# Altium schematic symbol library jlcpcb_2025_04_capacitors_extended_0805.schlib: 3281 symbols (part 16 of 18) (continued)
## GRT21BR71E225KE13L
designator C?  Capacitance: 2.2uF  (hidden comment: *)
Capacitor, Ceramic (MLCC), 2.2uF, ±10%, 25V, X7R, ±10%, SMD 0805; Manufacturer: Murata Electronics; Manufacturer Part Number: GRT21BR71E225KE13L; Package Size: 0805; JLCPCB Basic Part: No; JLCPCB Part Number: C723892; Supplier 1: LCSC; Category: Capacitors - MLCC; Supplier Part Number 1: C723892; Tolerance: ±10%; Voltage Rating: 25V; Temperature Coefficient: X7R; RoHS: Yes; ComponentLink1Description: Datasheet; ComponentLink1URL: https://wmsc.lcsc.com/wmsc/upload/file/pdf/v2/lcsc/2008241234_Murata-Electronics-GRT21BR71E225KE13L_C723892.pdf; ComponentLink2Description: JLCPCB Part URL; ComponentLink2URL: https://jlcpcb.com/partdetail/C723892; ComponentLink3Description: LCSC Part URL; ComponentLink3URL: https://lcsc.com/product-detail/Multilayer-Ceramic-Capacitors-MLCC---SMD-SMT_Murata-Electronics-Murata-Electronics-GRT21BR71E225KE13L_C723892.html
footprint CAP-0805 (0805 (2012M) Capacitor)
pins: 1, 2

## GRT21BR71H104KE01L
designator C?  Capacitance: 100nF  (hidden comment: *)
Capacitor, Ceramic (MLCC), 100nF, ±10%, null, X7R, ±10%, SMD 0805; Manufacturer: Murata Electronics; Manufacturer Part Number: GRT21BR71H104KE01L; Package Size: 0805; JLCPCB Basic Part: No; JLCPCB Part Number: C782178; Supplier 1: LCSC; Category: Capacitors - MLCC; Supplier Part Number 1: C782178; Tolerance: ±10%; Voltage Rating: null; Temperature Coefficient: X7R; RoHS: Yes; ComponentLink1Description: Datasheet; ComponentLink1URL: https://wmsc.lcsc.com/wmsc/upload/file/pdf/v2/lcsc/2009161209_Murata-Electronics-GRT21BR71H104KE01L_C782178.pdf; ComponentLink2Description: JLCPCB Part URL; ComponentLink2URL: https://jlcpcb.com/partdetail/C782178; ComponentLink3Description: LCSC Part URL; ComponentLink3URL: https://lcsc.com/product-detail/Multilayer-Ceramic-Capacitors-MLCC---SMD-SMT_Murata-Electronics-Murata-Electronics-GRT21BR71H104KE01L_C782178.html
footprint CAP-0805 (0805 (2012M) Capacitor)
pins: 1, 2

## GRT21BR71H105KE01L
designator C?  Capacitance: 1uF  (hidden comment: *)
Capacitor, Ceramic (MLCC), 1uF, ±10%, null, X7R, ±10%, SMD 0805; Manufacturer: Murata Electronics; Manufacturer Part Number: GRT21BR71H105KE01L; Package Size: 0805; JLCPCB Basic Part: No; JLCPCB Part Number: C701194; Supplier 1: LCSC; Category: Capacitors - MLCC; Supplier Part Number 1: C701194; Tolerance: ±10%; Voltage Rating: null; Temperature Coefficient: X7R; RoHS: Yes; ComponentLink1Description: Datasheet; ComponentLink1URL: https://wmsc.lcsc.com/wmsc/upload/file/pdf/v2/lcsc/2009161208_Murata-Electronics-GRT21BR71H105KE01L_C701194.pdf; ComponentLink2Description: JLCPCB Part URL; ComponentLink2URL: https://jlcpcb.com/partdetail/C701194; ComponentLink3Description: LCSC Part URL; ComponentLink3URL: https://lcsc.com/product-detail/Multilayer-Ceramic-Capacitors-MLCC---SMD-SMT_Murata-Electronics-Murata-Electronics-GRT21BR71H105KE01L_C701194.html
footprint CAP-0805 (0805 (2012M) Capacitor)
pins: 1, 2

## HGC0805G0101J500NTGJ
designator C?  Capacitance: 100pF  (hidden comment: *)
Capacitor, Ceramic (MLCC), 100pF, ±5%, 50V, C0G, ±5%, SMD 0805; Manufacturer: Chinocera; Manufacturer Part Number: HGC0805G0101J500NTGJ; Package Size: 0805; JLCPCB Basic Part: No; JLCPCB Part Number: C465167; Supplier 1: LCSC; Category: Capacitors - MLCC; Supplier Part Number 1: C465167; Tolerance: ±5%; Voltage Rating: 50V; Temperature Coefficient: C0G; RoHS: Yes; ComponentLink1Description: Datasheet; ComponentLink1URL: https://wmsc.lcsc.com/wmsc/upload/file/pdf/v2/lcsc/2403201120_Chinocera-HGC0805G0101J500NTGJ_C465167.pdf; ComponentLink2Description: JLCPCB Part URL; ComponentLink2URL: https://jlcpcb.com/partdetail/C465167; ComponentLink3Description: LCSC Part URL; ComponentLink3URL: https://lcsc.com/product-detail/Multilayer-Ceramic-Capacitors-MLCC---SMD-SMT_Chinocera-Chinocera-HGC0805G0101J500NTGJ_C465167.html
footprint CAP-0805 (0805 (2012M) Capacitor)
pins: 1, 2

## HGC0805G0270J500NTGJ
designator C?  Capacitance: 27pF  (hidden comment: *)
Capacitor, Ceramic (MLCC), 27pF, ±5%, 50V, C0G, ±5%, SMD 0805; Manufacturer: Chinocera; Manufacturer Part Number: HGC0805G0270J500NTGJ; Package Size: 0805; JLCPCB Basic Part: No; JLCPCB Part Number: C5186741; Supplier 1: LCSC; Category: Capacitors - MLCC; Supplier Part Number 1: C5186741; Tolerance: ±5%; Voltage Rating: 50V; Temperature Coefficient: C0G; RoHS: Yes; ComponentLink1Description: Datasheet; ComponentLink1URL: https://wmsc.lcsc.com/wmsc/upload/file/pdf/v2/lcsc/2403201120_Chinocera-HGC0805G0270J500NTGJ_C5186741.pdf; ComponentLink2Description: JLCPCB Part URL; ComponentLink2URL: https://jlcpcb.com/partdetail/C5186741; ComponentLink3Description: LCSC Part URL; ComponentLink3URL: https://lcsc.com/product-detail/Multilayer-Ceramic-Capacitors-MLCC---SMD-SMT_Chinocera-Chinocera-HGC0805G0270J500NTGJ_C5186741.html
footprint CAP-0805 (0805 (2012M) Capacitor)
pins: 1, 2

## HGC0805G0300J500NTHJ
designator C?  Capacitance: 30pF  (hidden comment: *)
Capacitor, Ceramic (MLCC), 30pF, ±5%, 50V, C0G, ±5%, SMD 0805; Manufacturer: Chinocera; Manufacturer Part Number: HGC0805G0300J500NTHJ; Package Size: 0805; JLCPCB Basic Part: No; JLCPCB Part Number: C465169; Supplier 1: LCSC; Category: Capacitors - MLCC; Supplier Part Number 1: C465169; Tolerance: ±5%; Voltage Rating: 50V; Temperature Coefficient: C0G; RoHS: Yes; ComponentLink1Description: Datasheet; ComponentLink1URL: https://wmsc.lcsc.com/wmsc/upload/file/pdf/v2/lcsc/2403201120_Chinocera-HGC0805G0300J500NTHJ_C465169.pdf; ComponentLink2Description: JLCPCB Part URL; ComponentLink2URL: https://jlcpcb.com/partdetail/C465169; ComponentLink3Description: LCSC Part URL; ComponentLink3URL: https://lcsc.com/product-detail/Multilayer-Ceramic-Capacitors-MLCC---SMD-SMT_Chinocera-Chinocera-HGC0805G0300J500NTHJ_C465169.html
footprint CAP-0805 (0805 (2012M) Capacitor)
pins: 1, 2

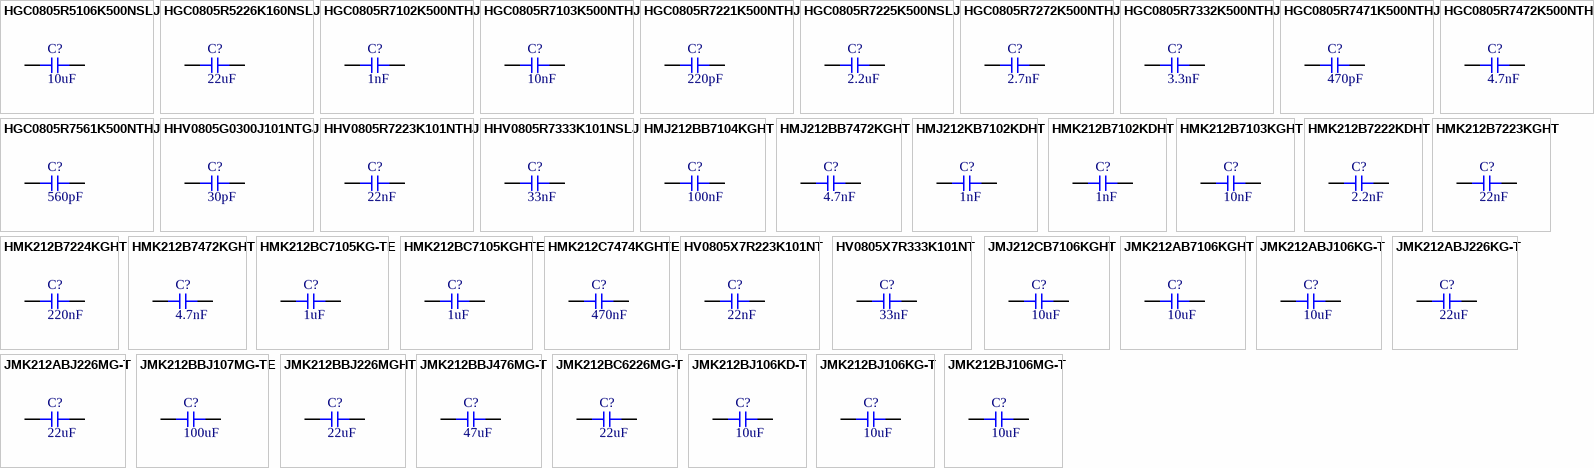
[diagram p70: symbols HGC0805R5106K500NSLJ to JMK212BJ106MG-T]

## HGC0805R5106K500NSLJ
designator C?  Capacitance: 10uF  (hidden comment: *)
Capacitor, Ceramic (MLCC), 10uF, ±10%, 50V, X5R, ±10%, SMD 0805; Manufacturer: Chinocera; Manufacturer Part Number: HGC0805R5106K500NSLJ; Package Size: 0805; JLCPCB Basic Part: No; JLCPCB Part Number: C22367830; Supplier 1: LCSC; Category: Capacitors - MLCC; Supplier Part Number 1: C22367830; Tolerance: ±10%; Voltage Rating: 50V; Temperature Coefficient: X5R; RoHS: Yes; ComponentLink1Description: Datasheet; ComponentLink1URL: https://wmsc.lcsc.com/wmsc/upload/file/pdf/v2/lcsc/2403261047_Chinocera-HGC0805R5106K500NSLJ_C22367830.pdf; ComponentLink2Description: JLCPCB Part URL; ComponentLink2URL: https://jlcpcb.com/partdetail/C22367830; ComponentLink3Description: LCSC Part URL; ComponentLink3URL: https://lcsc.com/product-detail/Multilayer-Ceramic-Capacitors-MLCC---SMD-SMT_Chinocera-Chinocera-HGC0805R5106K500NSLJ_C22367830.html
footprint CAP-0805 (0805 (2012M) Capacitor)
pins: 1, 2

## HGC0805R5226K160NSLJ
designator C?  Capacitance: 22uF  (hidden comment: *)
Capacitor, Ceramic (MLCC), 22uF, ±10%, 16V, X5R, ±10%, SMD 0805; Manufacturer: Chinocera; Manufacturer Part Number: HGC0805R5226K160NSLJ; Package Size: 0805; JLCPCB Basic Part: No; JLCPCB Part Number: C7472967; Supplier 1: LCSC; Category: Capacitors - MLCC; Supplier Part Number 1: C7472967; Tolerance: ±10%; Voltage Rating: 16V; Temperature Coefficient: X5R; RoHS: Yes; ComponentLink1Description: Datasheet; ComponentLink1URL: https://wmsc.lcsc.com/wmsc/upload/file/pdf/v2/lcsc/2403201122_Chinocera-HGC0805R5226K160NSLJ_C7472967.pdf; ComponentLink2Description: JLCPCB Part URL; ComponentLink2URL: https://jlcpcb.com/partdetail/C7472967; ComponentLink3Description: LCSC Part URL; ComponentLink3URL: https://lcsc.com/product-detail/Multilayer-Ceramic-Capacitors-MLCC---SMD-SMT_Chinocera-Chinocera-HGC0805R5226K160NSLJ_C7472967.html
footprint CAP-0805 (0805 (2012M) Capacitor)
pins: 1, 2

## HGC0805R7102K500NTHJ
designator C?  Capacitance: 1nF  (hidden comment: *)
Capacitor, Ceramic (MLCC), 1nF, ±10%, 50V, X7R, ±10%, SMD 0805; Manufacturer: Chinocera; Manufacturer Part Number: HGC0805R7102K500NTHJ; Package Size: 0805; JLCPCB Basic Part: No; JLCPCB Part Number: C465161; Supplier 1: LCSC; Category: Capacitors - MLCC; Supplier Part Number 1: C465161; Tolerance: ±10%; Voltage Rating: 50V; Temperature Coefficient: X7R; RoHS: Yes; ComponentLink1Description: Datasheet; ComponentLink1URL: https://wmsc.lcsc.com/wmsc/upload/file/pdf/v2/lcsc/2403201120_Chinocera-HGC0805R7102K500NTHJ_C465161.pdf; ComponentLink2Description: JLCPCB Part URL; ComponentLink2URL: https://jlcpcb.com/partdetail/C465161; ComponentLink3Description: LCSC Part URL; ComponentLink3URL: https://lcsc.com/product-detail/Multilayer-Ceramic-Capacitors-MLCC---SMD-SMT_Chinocera-Chinocera-HGC0805R7102K500NTHJ_C465161.html
footprint CAP-0805 (0805 (2012M) Capacitor)
pins: 1, 2

## HGC0805R7103K500NTHJ
designator C?  Capacitance: 10nF  (hidden comment: *)
Capacitor, Ceramic (MLCC), 10nF, ±10%, 50V, X7R, ±10%, SMD 0805; Manufacturer: Chinocera; Manufacturer Part Number: HGC0805R7103K500NTHJ; Package Size: 0805; JLCPCB Basic Part: No; JLCPCB Part Number: C465162; Supplier 1: LCSC; Category: Capacitors - MLCC; Supplier Part Number 1: C465162; Tolerance: ±10%; Voltage Rating: 50V; Temperature Coefficient: X7R; RoHS: Yes; ComponentLink1Description: Datasheet; ComponentLink1URL: https://wmsc.lcsc.com/wmsc/upload/file/pdf/v2/lcsc/2403201120_Chinocera-HGC0805R7103K500NTHJ_C465162.pdf; ComponentLink2Description: JLCPCB Part URL; ComponentLink2URL: https://jlcpcb.com/partdetail/C465162; ComponentLink3Description: LCSC Part URL; ComponentLink3URL: https://lcsc.com/product-detail/Multilayer-Ceramic-Capacitors-MLCC---SMD-SMT_Chinocera-Chinocera-HGC0805R7103K500NTHJ_C465162.html
footprint CAP-0805 (0805 (2012M) Capacitor)
pins: 1, 2

## HGC0805R7221K500NTHJ
designator C?  Capacitance: 220pF  (hidden comment: *)
Capacitor, Ceramic (MLCC), 220pF, ±10%, 50V, X7R, ±10%, SMD 0805; Manufacturer: Chinocera; Manufacturer Part Number: HGC0805R7221K500NTHJ; Package Size: 0805; JLCPCB Basic Part: No; JLCPCB Part Number: C465163; Supplier 1: LCSC; Category: Capacitors - MLCC; Supplier Part Number 1: C465163; Tolerance: ±10%; Voltage Rating: 50V; Temperature Coefficient: X7R; RoHS: Yes; ComponentLink1Description: Datasheet; ComponentLink1URL: https://wmsc.lcsc.com/wmsc/upload/file/pdf/v2/lcsc/2403201120_Chinocera-HGC0805R7221K500NTHJ_C465163.pdf; ComponentLink2Description: JLCPCB Part URL; ComponentLink2URL: https://jlcpcb.com/partdetail/C465163; ComponentLink3Description: LCSC Part URL; ComponentLink3URL: https://lcsc.com/product-detail/Multilayer-Ceramic-Capacitors-MLCC---SMD-SMT_Chinocera-Chinocera-HGC0805R7221K500NTHJ_C465163.html
footprint CAP-0805 (0805 (2012M) Capacitor)
pins: 1, 2

## HGC0805R7225K500NSLJ
designator C?  Capacitance: 2.2uF  (hidden comment: *)
Capacitor, Ceramic (MLCC), 2.2uF, ±10%, null, X7R, ±10%, SMD 0805; Manufacturer: Chinocera; Manufacturer Part Number: HGC0805R7225K500NSLJ; Package Size: 0805; JLCPCB Basic Part: No; JLCPCB Part Number: C7432779; Supplier 1: LCSC; Category: Capacitors - MLCC; Supplier Part Number 1: C7432779; Tolerance: ±10%; Voltage Rating: null; Temperature Coefficient: X7R; RoHS: Yes; ComponentLink1Description: Datasheet; ComponentLink1URL: https://wmsc.lcsc.com/wmsc/upload/file/pdf/v2/lcsc/2403201122_Chinocera-HGC0805R7225K500NSLJ_C7432779.pdf; ComponentLink2Description: JLCPCB Part URL; ComponentLink2URL: https://jlcpcb.com/partdetail/C7432779; ComponentLink3Description: LCSC Part URL; ComponentLink3URL: https://lcsc.com/product-detail/Multilayer-Ceramic-Capacitors-MLCC---SMD-SMT_Chinocera-Chinocera-HGC0805R7225K500NSLJ_C7432779.html
footprint CAP-0805 (0805 (2012M) Capacitor)
pins: 1, 2

## HGC0805R7272K500NTHJ
designator C?  Capacitance: 2.7nF  (hidden comment: *)
Capacitor, Ceramic (MLCC), 2.7nF, ±10%, 50V, X7R, ±10%, SMD 0805; Manufacturer: Chinocera; Manufacturer Part Number: HGC0805R7272K500NTHJ; Package Size: 0805; JLCPCB Basic Part: No; JLCPCB Part Number: C5186791; Supplier 1: LCSC; Category: Capacitors - MLCC; Supplier Part Number 1: C5186791; Tolerance: ±10%; Voltage Rating: 50V; Temperature Coefficient: X7R; RoHS: Yes; ComponentLink1Description: Datasheet; ComponentLink1URL: https://wmsc.lcsc.com/wmsc/upload/file/pdf/v2/lcsc/2403201121_Chinocera-HGC0805R7272K500NTHJ_C5186791.pdf; ComponentLink2Description: JLCPCB Part URL; ComponentLink2URL: https://jlcpcb.com/partdetail/C5186791; ComponentLink3Description: LCSC Part URL; ComponentLink3URL: https://lcsc.com/product-detail/Multilayer-Ceramic-Capacitors-MLCC---SMD-SMT_Chinocera-Chinocera-HGC0805R7272K500NTHJ_C5186791.html
footprint CAP-0805 (0805 (2012M) Capacitor)
pins: 1, 2

## HGC0805R7332K500NTHJ
designator C?  Capacitance: 3.3nF  (hidden comment: *)
Capacitor, Ceramic (MLCC), 3.3nF, ±10%, 50V, X7R, ±10%, SMD 0805; Manufacturer: Chinocera; Manufacturer Part Number: HGC0805R7332K500NTHJ; Package Size: 0805; JLCPCB Basic Part: No; JLCPCB Part Number: C465164; Supplier 1: LCSC; Category: Capacitors - MLCC; Supplier Part Number 1: C465164; Tolerance: ±10%; Voltage Rating: 50V; Temperature Coefficient: X7R; RoHS: Yes; ComponentLink1Description: Datasheet; ComponentLink1URL: https://wmsc.lcsc.com/wmsc/upload/file/pdf/v2/lcsc/2403201120_Chinocera-HGC0805R7332K500NTHJ_C465164.pdf; ComponentLink2Description: JLCPCB Part URL; ComponentLink2URL: https://jlcpcb.com/partdetail/C465164; ComponentLink3Description: LCSC Part URL; ComponentLink3URL: https://lcsc.com/product-detail/Multilayer-Ceramic-Capacitors-MLCC---SMD-SMT_Chinocera-Chinocera-HGC0805R7332K500NTHJ_C465164.html
footprint CAP-0805 (0805 (2012M) Capacitor)
pins: 1, 2

## HGC0805R7471K500NTHJ
designator C?  Capacitance: 470pF  (hidden comment: *)
Capacitor, Ceramic (MLCC), 470pF, ±10%, 50V, X7R, ±10%, SMD 0805; Manufacturer: Chinocera; Manufacturer Part Number: HGC0805R7471K500NTHJ; Package Size: 0805; JLCPCB Basic Part: No; JLCPCB Part Number: C465165; Supplier 1: LCSC; Category: Capacitors - MLCC; Supplier Part Number 1: C465165; Tolerance: ±10%; Voltage Rating: 50V; Temperature Coefficient: X7R; RoHS: Yes; ComponentLink1Description: Datasheet; ComponentLink1URL: https://wmsc.lcsc.com/wmsc/upload/file/pdf/v2/lcsc/2403201120_Chinocera-HGC0805R7471K500NTHJ_C465165.pdf; ComponentLink2Description: JLCPCB Part URL; ComponentLink2URL: https://jlcpcb.com/partdetail/C465165; ComponentLink3Description: LCSC Part URL; ComponentLink3URL: https://lcsc.com/product-detail/Multilayer-Ceramic-Capacitors-MLCC---SMD-SMT_Chinocera-Chinocera-HGC0805R7471K500NTHJ_C465165.html
footprint CAP-0805 (0805 (2012M) Capacitor)
pins: 1, 2

## HGC0805R7472K500NTHJ
designator C?  Capacitance: 4.7nF  (hidden comment: *)
Capacitor, Ceramic (MLCC), 4.7nF, ±10%, 50V, X7R, ±10%, SMD 0805; Manufacturer: Chinocera; Manufacturer Part Number: HGC0805R7472K500NTHJ; Package Size: 0805; JLCPCB Basic Part: No; JLCPCB Part Number: C465166; Supplier 1: LCSC; Category: Capacitors - MLCC; Supplier Part Number 1: C465166; Tolerance: ±10%; Voltage Rating: 50V; Temperature Coefficient: X7R; RoHS: Yes; ComponentLink1Description: Datasheet; ComponentLink1URL: https://wmsc.lcsc.com/wmsc/upload/file/pdf/v2/lcsc/2403201120_Chinocera-HGC0805R7472K500NTHJ_C465166.pdf; ComponentLink2Description: JLCPCB Part URL; ComponentLink2URL: https://jlcpcb.com/partdetail/C465166; ComponentLink3Description: LCSC Part URL; ComponentLink3URL: https://lcsc.com/product-detail/Multilayer-Ceramic-Capacitors-MLCC---SMD-SMT_Chinocera-Chinocera-HGC0805R7472K500NTHJ_C465166.html
footprint CAP-0805 (0805 (2012M) Capacitor)
pins: 1, 2

## HGC0805R7561K500NTHJ
designator C?  Capacitance: 560pF  (hidden comment: *)
Capacitor, Ceramic (MLCC), 560pF, ±10%, 50V, X7R, ±10%, SMD 0805; Manufacturer: Chinocera; Manufacturer Part Number: HGC0805R7561K500NTHJ; Package Size: 0805; JLCPCB Basic Part: No; JLCPCB Part Number: C5186812; Supplier 1: LCSC; Category: Capacitors - MLCC; Supplier Part Number 1: C5186812; Tolerance: ±10%; Voltage Rating: 50V; Temperature Coefficient: X7R; RoHS: Yes; ComponentLink1Description: Datasheet; ComponentLink1URL: https://wmsc.lcsc.com/wmsc/upload/file/pdf/v2/lcsc/2403201121_Chinocera-HGC0805R7561K500NTHJ_C5186812.pdf; ComponentLink2Description: JLCPCB Part URL; ComponentLink2URL: https://jlcpcb.com/partdetail/C5186812; ComponentLink3Description: LCSC Part URL; ComponentLink3URL: https://lcsc.com/product-detail/Multilayer-Ceramic-Capacitors-MLCC---SMD-SMT_Chinocera-Chinocera-HGC0805R7561K500NTHJ_C5186812.html
footprint CAP-0805 (0805 (2012M) Capacitor)
pins: 1, 2

## HHV0805G0300J101NTGJ
designator C?  Capacitance: 30pF  (hidden comment: *)
Capacitor, Ceramic (MLCC), 30pF, 100V, C0G, SMD 0805; Manufacturer: Chinocera; Manufacturer Part Number: HHV0805G0300J101NTGJ; Package Size: 0805; JLCPCB Basic Part: No; JLCPCB Part Number: C5186745; Supplier 1: LCSC; Category: Capacitors - MLCC; Supplier Part Number 1: C5186745; Voltage Rating: 100V; Temperature Coefficient: C0G; RoHS: Yes; ComponentLink1Description: Datasheet; ComponentLink1URL: https://wmsc.lcsc.com/wmsc/upload/file/pdf/v2/lcsc/2403201120_Chinocera-HHV0805G0300J101NTGJ_C5186745.pdf; ComponentLink2Description: JLCPCB Part URL; ComponentLink2URL: https://jlcpcb.com/partdetail/C5186745; ComponentLink3Description: LCSC Part URL; ComponentLink3URL: https://lcsc.com/product-detail/Multilayer-Ceramic-Capacitors-MLCC---SMD-SMT_Chinocera-Chinocera-HHV0805G0300J101NTGJ_C5186745.html
footprint CAP-0805 (0805 (2012M) Capacitor)
pins: 1, 2

## HHV0805R7223K101NTHJ
designator C?  Capacitance: 22nF  (hidden comment: *)
Capacitor, Ceramic (MLCC), 22nF, ±10%, 100V, X7R, ±10%, SMD 0805; Manufacturer: Chinocera; Manufacturer Part Number: HHV0805R7223K101NTHJ; Package Size: 0805; JLCPCB Basic Part: No; JLCPCB Part Number: C5186789; Supplier 1: LCSC; Category: Capacitors - MLCC; Supplier Part Number 1: C5186789; Tolerance: ±10%; Voltage Rating: 100V; Temperature Coefficient: X7R; RoHS: Yes; ComponentLink1Description: Datasheet; ComponentLink1URL: https://wmsc.lcsc.com/wmsc/upload/file/pdf/v2/lcsc/2403201121_Chinocera-HHV0805R7223K101NTHJ_C5186789.pdf; ComponentLink2Description: JLCPCB Part URL; ComponentLink2URL: https://jlcpcb.com/partdetail/C5186789; ComponentLink3Description: LCSC Part URL; ComponentLink3URL: https://lcsc.com/product-detail/Multilayer-Ceramic-Capacitors-MLCC---SMD-SMT_Chinocera-Chinocera-HHV0805R7223K101NTHJ_C5186789.html
footprint CAP-0805 (0805 (2012M) Capacitor)
pins: 1, 2

## HHV0805R7333K101NSLJ
designator C?  Capacitance: 33nF  (hidden comment: *)
Capacitor, Ceramic (MLCC), 33nF, ±10%, 100V, X7R, ±10%, SMD 0805; Manufacturer: Chinocera; Manufacturer Part Number: HHV0805R7333K101NSLJ; Package Size: 0805; JLCPCB Basic Part: No; JLCPCB Part Number: C5186796; Supplier 1: LCSC; Category: Capacitors - MLCC; Supplier Part Number 1: C5186796; Tolerance: ±10%; Voltage Rating: 100V; Temperature Coefficient: X7R; RoHS: Yes; ComponentLink1Description: Datasheet; ComponentLink1URL: https://wmsc.lcsc.com/wmsc/upload/file/pdf/v2/lcsc/2403201121_Chinocera-HHV0805R7333K101NSLJ_C5186796.pdf; ComponentLink2Description: JLCPCB Part URL; ComponentLink2URL: https://jlcpcb.com/partdetail/C5186796; ComponentLink3Description: LCSC Part URL; ComponentLink3URL: https://lcsc.com/product-detail/Multilayer-Ceramic-Capacitors-MLCC---SMD-SMT_Chinocera-Chinocera-HHV0805R7333K101NSLJ_C5186796.html
footprint CAP-0805 (0805 (2012M) Capacitor)
pins: 1, 2

## HMJ212BB7104KGHT
designator C?  Capacitance: 100nF  (hidden comment: *)
Capacitor, Ceramic (MLCC), 100nF, ±10%, 100V, X7R, ±10%, SMD 0805; Manufacturer: Taiyo Yuden; Manufacturer Part Number: HMJ212BB7104KGHT; Package Size: 0805; JLCPCB Basic Part: No; JLCPCB Part Number: C651015; Supplier 1: LCSC; Category: Capacitors - MLCC; Supplier Part Number 1: C651015; Tolerance: ±10%; Voltage Rating: 100V; Temperature Coefficient: X7R; RoHS: Yes; ComponentLink1Description: Datasheet; ComponentLink1URL: https://wmsc.lcsc.com/wmsc/upload/file/pdf/v2/lcsc/2304140030_Taiyo-Yuden-HMJ212BB7104KGHT_C651015.pdf; ComponentLink2Description: JLCPCB Part URL; ComponentLink2URL: https://jlcpcb.com/partdetail/C651015; ComponentLink3Description: LCSC Part URL; ComponentLink3URL: https://lcsc.com/product-detail/Multilayer-Ceramic-Capacitors-MLCC---SMD-SMT_Taiyo-Yuden-Taiyo-Yuden-HMJ212BB7104KGHT_C651015.html
footprint CAP-0805 (0805 (2012M) Capacitor)
pins: 1, 2

## HMJ212BB7472KGHT
designator C?  Capacitance: 4.7nF  (hidden comment: *)
Capacitor, Ceramic (MLCC), 4.7nF, ±10%, 100V, X7R, ±10%, SMD 0805; Manufacturer: Taiyo Yuden; Manufacturer Part Number: HMJ212BB7472KGHT; Package Size: 0805; JLCPCB Basic Part: No; JLCPCB Part Number: C2175141; Supplier 1: LCSC; Category: Capacitors - MLCC; Supplier Part Number 1: C2175141; Tolerance: ±10%; Voltage Rating: 100V; Temperature Coefficient: X7R; RoHS: Yes; ComponentLink1Description: Datasheet; ComponentLink1URL: https://wmsc.lcsc.com/wmsc/upload/file/pdf/v2/lcsc/2309051400_Taiyo-Yuden-HMJ212BB7472KGHT_C2175141.pdf; ComponentLink2Description: JLCPCB Part URL; ComponentLink2URL: https://jlcpcb.com/partdetail/C2175141; ComponentLink3Description: LCSC Part URL; ComponentLink3URL: https://lcsc.com/product-detail/Multilayer-Ceramic-Capacitors-MLCC---SMD-SMT_Taiyo-Yuden-Taiyo-Yuden-HMJ212BB7472KGHT_C2175141.html
footprint CAP-0805 (0805 (2012M) Capacitor)
pins: 1, 2

## HMJ212KB7102KDHT
designator C?  Capacitance: 1nF  (hidden comment: *)
Capacitor, Ceramic (MLCC), 1nF, ±10%, 100V, ±10%, SMD 0805; Manufacturer: Taiyo Yuden; Manufacturer Part Number: HMJ212KB7102KDHT; Package Size: 0805; JLCPCB Basic Part: No; JLCPCB Part Number: C454105; Supplier 1: LCSC; Category: Capacitors - MLCC; Supplier Part Number 1: C454105; Tolerance: ±10%; Voltage Rating: 100V; RoHS: Yes; ComponentLink1Description: Datasheet; ComponentLink1URL: https://wmsc.lcsc.com/wmsc/upload/file/pdf/v2/lcsc/2304140030_Taiyo-Yuden-HMJ212KB7102KDHT_C454105.pdf; ComponentLink2Description: JLCPCB Part URL; ComponentLink2URL: https://jlcpcb.com/partdetail/C454105; ComponentLink3Description: LCSC Part URL; ComponentLink3URL: https://lcsc.com/product-detail/Multilayer-Ceramic-Capacitors-MLCC---SMD-SMT_Taiyo-Yuden-Taiyo-Yuden-HMJ212KB7102KDHT_C454105.html
footprint CAP-0805 (0805 (2012M) Capacitor)
pins: 1, 2

## HMK212B7102KDHT
designator C?  Capacitance: 1nF  (hidden comment: *)
Capacitor, Ceramic (MLCC), 1nF, ±10%, 100V, X7R, ±10%, SMD 0805; Manufacturer: Taiyo Yuden; Manufacturer Part Number: HMK212B7102KDHT; Package Size: 0805; JLCPCB Basic Part: No; JLCPCB Part Number: C650994; Supplier 1: LCSC; Category: Capacitors - MLCC; Supplier Part Number 1: C650994; Tolerance: ±10%; Voltage Rating: 100V; Temperature Coefficient: X7R; RoHS: Yes; ComponentLink1Description: Datasheet; ComponentLink1URL: https://wmsc.lcsc.com/wmsc/upload/file/pdf/v2/lcsc/2304140030_Taiyo-Yuden-HMK212B7102KDHT_C650994.pdf; ComponentLink2Description: JLCPCB Part URL; ComponentLink2URL: https://jlcpcb.com/partdetail/C650994; ComponentLink3Description: LCSC Part URL; ComponentLink3URL: https://lcsc.com/product-detail/Multilayer-Ceramic-Capacitors-MLCC---SMD-SMT_Taiyo-Yuden-Taiyo-Yuden-HMK212B7102KDHT_C650994.html
footprint CAP-0805 (0805 (2012M) Capacitor)
pins: 1, 2

## HMK212B7103KGHT
designator C?  Capacitance: 10nF  (hidden comment: *)
Capacitor, Ceramic (MLCC), 10nF, ±10%, 100V, X7R, ±10%, SMD 0805; Manufacturer: Taiyo Yuden; Manufacturer Part Number: HMK212B7103KGHT; Package Size: 0805; JLCPCB Basic Part: No; JLCPCB Part Number: C385973; Supplier 1: LCSC; Category: Capacitors - MLCC; Supplier Part Number 1: C385973; Tolerance: ±10%; Voltage Rating: 100V; Temperature Coefficient: X7R; RoHS: Yes; ComponentLink1Description: Datasheet; ComponentLink1URL: https://wmsc.lcsc.com/wmsc/upload/file/pdf/v2/lcsc/2211282230_Taiyo-Yuden-HMK212B7103KGHT_C385973.pdf; ComponentLink2Description: JLCPCB Part URL; ComponentLink2URL: https://jlcpcb.com/partdetail/C385973; ComponentLink3Description: LCSC Part URL; ComponentLink3URL: https://lcsc.com/product-detail/Multilayer-Ceramic-Capacitors-MLCC---SMD-SMT_Taiyo-Yuden-Taiyo-Yuden-HMK212B7103KGHT_C385973.html
footprint CAP-0805 (0805 (2012M) Capacitor)
pins: 1, 2

## HMK212B7222KDHT
designator C?  Capacitance: 2.2nF  (hidden comment: *)
Capacitor, Ceramic (MLCC), 2.2nF, ±10%, 100V, X7R, ±10%, SMD 0805; Manufacturer: Taiyo Yuden; Manufacturer Part Number: HMK212B7222KDHT; Package Size: 0805; JLCPCB Basic Part: No; JLCPCB Part Number: C650996; Supplier 1: LCSC; Category: Capacitors - MLCC; Supplier Part Number 1: C650996; Tolerance: ±10%; Voltage Rating: 100V; Temperature Coefficient: X7R; RoHS: Yes; ComponentLink1Description: Datasheet; ComponentLink1URL: https://wmsc.lcsc.com/wmsc/upload/file/pdf/v2/lcsc/2304140030_Taiyo-Yuden-HMK212B7222KDHT_C650996.pdf; ComponentLink2Description: JLCPCB Part URL; ComponentLink2URL: https://jlcpcb.com/partdetail/C650996; ComponentLink3Description: LCSC Part URL; ComponentLink3URL: https://lcsc.com/product-detail/Multilayer-Ceramic-Capacitors-MLCC---SMD-SMT_Taiyo-Yuden-Taiyo-Yuden-HMK212B7222KDHT_C650996.html
footprint CAP-0805 (0805 (2012M) Capacitor)
pins: 1, 2

## HMK212B7223KGHT
designator C?  Capacitance: 22nF  (hidden comment: *)
Capacitor, Ceramic (MLCC), 22nF, ±10%, 100V, X7R, ±10%, SMD 0805; Manufacturer: Taiyo Yuden; Manufacturer Part Number: HMK212B7223KGHT; Package Size: 0805; JLCPCB Basic Part: No; JLCPCB Part Number: C385975; Supplier 1: LCSC; Category: Capacitors - MLCC; Supplier Part Number 1: C385975; Tolerance: ±10%; Voltage Rating: 100V; Temperature Coefficient: X7R; RoHS: Yes; ComponentLink1Description: Datasheet; ComponentLink1URL: https://wmsc.lcsc.com/wmsc/upload/file/pdf/v2/lcsc/2202082130_Taiyo-Yuden-HMK212B7223KGHT_C385975.pdf; ComponentLink2Description: JLCPCB Part URL; ComponentLink2URL: https://jlcpcb.com/partdetail/C385975; ComponentLink3Description: LCSC Part URL; ComponentLink3URL: https://lcsc.com/product-detail/Multilayer-Ceramic-Capacitors-MLCC---SMD-SMT_Taiyo-Yuden-Taiyo-Yuden-HMK212B7223KGHT_C385975.html
footprint CAP-0805 (0805 (2012M) Capacitor)
pins: 1, 2

## HMK212B7224KGHT
designator C?  Capacitance: 220nF  (hidden comment: *)
Capacitor, Ceramic (MLCC), 220nF, ±10%, 100V, X7R, ±10%, SMD 0805; Manufacturer: Taiyo Yuden; Manufacturer Part Number: HMK212B7224KGHT; Package Size: 0805; JLCPCB Basic Part: No; JLCPCB Part Number: C2880358; Supplier 1: LCSC; Category: Capacitors - MLCC; Supplier Part Number 1: C2880358; Tolerance: ±10%; Voltage Rating: 100V; Temperature Coefficient: X7R; RoHS: Yes; ComponentLink1Description: Datasheet; ComponentLink1URL: https://wmsc.lcsc.com/wmsc/upload/file/pdf/v2/lcsc/2108160930_Taiyo-Yuden-HMK212B7224KGHT_C2880358.pdf; ComponentLink2Description: JLCPCB Part URL; ComponentLink2URL: https://jlcpcb.com/partdetail/C2880358; ComponentLink3Description: LCSC Part URL; ComponentLink3URL: https://lcsc.com/product-detail/Multilayer-Ceramic-Capacitors-MLCC---SMD-SMT_Taiyo-Yuden-Taiyo-Yuden-HMK212B7224KGHT_C2880358.html
footprint CAP-0805 (0805 (2012M) Capacitor)
pins: 1, 2

## HMK212B7472KGHT
designator C?  Capacitance: 4.7nF  (hidden comment: *)
Capacitor, Ceramic (MLCC), 4.7nF, ±10%, 100V, X7R, ±10%, SMD 0805; Manufacturer: Taiyo Yuden; Manufacturer Part Number: HMK212B7472KGHT; Package Size: 0805; JLCPCB Basic Part: No; JLCPCB Part Number: C651023; Supplier 1: LCSC; Category: Capacitors - MLCC; Supplier Part Number 1: C651023; Tolerance: ±10%; Voltage Rating: 100V; Temperature Coefficient: X7R; RoHS: Yes; ComponentLink1Description: Datasheet; ComponentLink1URL: https://wmsc.lcsc.com/wmsc/upload/file/pdf/v2/lcsc/2304140030_Taiyo-Yuden-HMK212B7472KGHT_C651023.pdf; ComponentLink2Description: JLCPCB Part URL; ComponentLink2URL: https://jlcpcb.com/partdetail/C651023; ComponentLink3Description: LCSC Part URL; ComponentLink3URL: https://lcsc.com/product-detail/Multilayer-Ceramic-Capacitors-MLCC---SMD-SMT_Taiyo-Yuden-Taiyo-Yuden-HMK212B7472KGHT_C651023.html
footprint CAP-0805 (0805 (2012M) Capacitor)
pins: 1, 2

## HMK212BC7105KG-TE
designator C?  Capacitance: 1uF  (hidden comment: *)
Capacitor, Ceramic (MLCC), 1uF, ±10%, 100V, X7S, ±10%, SMD 0805; Manufacturer: Taiyo Yuden; Manufacturer Part Number: HMK212BC7105KG-TE; Package Size: 0805; JLCPCB Basic Part: No; JLCPCB Part Number: C2171077; Supplier 1: LCSC; Category: Capacitors - MLCC; Supplier Part Number 1: C2171077; Tolerance: ±10%; Voltage Rating: 100V; Temperature Coefficient: X7S; RoHS: Yes; ComponentLink1Description: Datasheet; ComponentLink1URL: https://wmsc.lcsc.com/wmsc/upload/file/pdf/v2/lcsc/2211282030_Taiyo-Yuden-HMK212BC7105KG-TE_C2171077.pdf; ComponentLink2Description: JLCPCB Part URL; ComponentLink2URL: https://jlcpcb.com/partdetail/C2171077; ComponentLink3Description: LCSC Part URL; ComponentLink3URL: https://lcsc.com/product-detail/Multilayer-Ceramic-Capacitors-MLCC---SMD-SMT_Taiyo-Yuden-Taiyo-Yuden-HMK212BC7105KG-TE_C2171077.html
footprint CAP-0805 (0805 (2012M) Capacitor)
pins: 1, 2

## HMK212BC7105KGHTE
designator C?  Capacitance: 1uF  (hidden comment: *)
Capacitor, Ceramic (MLCC), 1uF, ±10%, 100V, ±10%, SMD 0805; Manufacturer: Taiyo Yuden; Manufacturer Part Number: HMK212BC7105KGHTE; Package Size: 0805; JLCPCB Basic Part: No; JLCPCB Part Number: C385977; Supplier 1: LCSC; Category: Capacitors - MLCC; Supplier Part Number 1: C385977; Tolerance: ±10%; Voltage Rating: 100V; RoHS: Yes; ComponentLink1Description: Datasheet; ComponentLink1URL: https://wmsc.lcsc.com/wmsc/upload/file/pdf/v2/lcsc/2211282230_Taiyo-Yuden-HMK212BC7105KGHTE_C385977.pdf; ComponentLink2Description: JLCPCB Part URL; ComponentLink2URL: https://jlcpcb.com/partdetail/C385977; ComponentLink3Description: LCSC Part URL; ComponentLink3URL: https://lcsc.com/product-detail/Multilayer-Ceramic-Capacitors-MLCC---SMD-SMT_Taiyo-Yuden-Taiyo-Yuden-HMK212BC7105KGHTE_C385977.html
footprint CAP-0805 (0805 (2012M) Capacitor)
pins: 1, 2

## HMK212C7474KGHTE
designator C?  Capacitance: 470nF  (hidden comment: *)
Capacitor, Ceramic (MLCC), 470nF, ±10%, 100V, X7S, ±10%, SMD 0805; Manufacturer: Taiyo Yuden; Manufacturer Part Number: HMK212C7474KGHTE; Package Size: 0805; JLCPCB Basic Part: No; JLCPCB Part Number: C2880359; Supplier 1: LCSC; Category: Capacitors - MLCC; Supplier Part Number 1: C2880359; Tolerance: ±10%; Voltage Rating: 100V; Temperature Coefficient: X7S; RoHS: Yes; ComponentLink1Description: Datasheet; ComponentLink1URL: https://wmsc.lcsc.com/wmsc/upload/file/pdf/v2/lcsc/2108160930_Taiyo-Yuden-HMK212C7474KGHTE_C2880359.pdf; ComponentLink2Description: JLCPCB Part URL; ComponentLink2URL: https://jlcpcb.com/partdetail/C2880359; ComponentLink3Description: LCSC Part URL; ComponentLink3URL: https://lcsc.com/product-detail/Multilayer-Ceramic-Capacitors-MLCC---SMD-SMT_Taiyo-Yuden-Taiyo-Yuden-HMK212C7474KGHTE_C2880359.html
footprint CAP-0805 (0805 (2012M) Capacitor)
pins: 1, 2

## HV0805X7R223K101NT
designator C?  Capacitance: 22nF  (hidden comment: *)
Capacitor, Ceramic (MLCC), 22nF, 100V, SMD 0805; Manufacturer: AIDE; Manufacturer Part Number: HV0805X7R223K101NT; Package Size: 0805; JLCPCB Basic Part: No; JLCPCB Part Number: C2691733; Supplier 1: LCSC; Category: Capacitors - MLCC; Supplier Part Number 1: C2691733; Voltage Rating: 100V; RoHS: Yes; ComponentLink1Description: Datasheet; ComponentLink1URL: https://datasheet.lcsc.com/lcsc/2103301637_AIDE-HV0805X7R223K101NT_C2691733.pdf; ComponentLink2Description: JLCPCB Part URL; ComponentLink2URL: https://jlcpcb.com/partdetail/C2691733; ComponentLink3Description: LCSC Part URL; ComponentLink3URL: https://lcsc.com/product-detail/Multilayer-Ceramic-Capacitors-MLCC---SMD-SMT_AIDE-AIDE-HV0805X7R223K101NT_C2691733.html
footprint CAP-0805 (0805 (2012M) Capacitor)
pins: 1, 2

## HV0805X7R333K101NT
designator C?  Capacitance: 33nF  (hidden comment: *)
Capacitor, Ceramic (MLCC), 33nF, 100V, SMD 0805; Manufacturer: AIDE; Manufacturer Part Number: HV0805X7R333K101NT; Package Size: 0805; JLCPCB Basic Part: No; JLCPCB Part Number: C2691739; Supplier 1: LCSC; Category: Capacitors - MLCC; Supplier Part Number 1: C2691739; Voltage Rating: 100V; RoHS: Yes; ComponentLink1Description: Datasheet; ComponentLink1URL: https://datasheet.lcsc.com/lcsc/2103301638_AIDE-HV0805X7R333K101NT_C2691739.pdf; ComponentLink2Description: JLCPCB Part URL; ComponentLink2URL: https://jlcpcb.com/partdetail/C2691739; ComponentLink3Description: LCSC Part URL; ComponentLink3URL: https://lcsc.com/product-detail/Multilayer-Ceramic-Capacitors-MLCC---SMD-SMT_AIDE-AIDE-HV0805X7R333K101NT_C2691739.html
footprint CAP-0805 (0805 (2012M) Capacitor)
pins: 1, 2

## JMJ212CB7106KGHT
designator C?  Capacitance: 10uF  (hidden comment: *)
Capacitor, Ceramic (MLCC), 10uF, ±10%, 6.3V, X7R, ±10%, SMD 0805; Manufacturer: Taiyo Yuden; Manufacturer Part Number: JMJ212CB7106KGHT; Package Size: 0805; JLCPCB Basic Part: No; JLCPCB Part Number: C2175050; Supplier 1: LCSC; Category: Capacitors - MLCC; Supplier Part Number 1: C2175050; Tolerance: ±10%; Voltage Rating: 6.3V; Temperature Coefficient: X7R; RoHS: Yes; ComponentLink1Description: Datasheet; ComponentLink1URL: https://wmsc.lcsc.com/wmsc/upload/file/pdf/v2/lcsc/2309051402_Taiyo-Yuden-JMJ212CB7106KGHT_C2175050.pdf; ComponentLink2Description: JLCPCB Part URL; ComponentLink2URL: https://jlcpcb.com/partdetail/C2175050; ComponentLink3Description: LCSC Part URL; ComponentLink3URL: https://lcsc.com/product-detail/Multilayer-Ceramic-Capacitors-MLCC---SMD-SMT_Taiyo-Yuden-Taiyo-Yuden-JMJ212CB7106KGHT_C2175050.html
footprint CAP-0805 (0805 (2012M) Capacitor)
pins: 1, 2

## JMK212AB7106KGHT
designator C?  Capacitance: 10uF  (hidden comment: *)
Capacitor, Ceramic (MLCC), 10uF, ±10%, 6.3V, X7R, ±10%, SMD 0805; Manufacturer: Taiyo Yuden; Manufacturer Part Number: JMK212AB7106KGHT; Package Size: 0805; JLCPCB Basic Part: No; JLCPCB Part Number: C386019; Supplier 1: LCSC; Category: Capacitors - MLCC; Supplier Part Number 1: C386019; Tolerance: ±10%; Voltage Rating: 6.3V; Temperature Coefficient: X7R; RoHS: Yes; ComponentLink1Description: Datasheet; ComponentLink1URL: https://wmsc.lcsc.com/wmsc/upload/file/pdf/v2/lcsc/2211282230_Taiyo-Yuden-JMK212AB7106KGHT_C386019.pdf; ComponentLink2Description: JLCPCB Part URL; ComponentLink2URL: https://jlcpcb.com/partdetail/C386019; ComponentLink3Description: LCSC Part URL; ComponentLink3URL: https://lcsc.com/product-detail/Multilayer-Ceramic-Capacitors-MLCC---SMD-SMT_Taiyo-Yuden-Taiyo-Yuden-JMK212AB7106KGHT_C386019.html
footprint CAP-0805 (0805 (2012M) Capacitor)
pins: 1, 2

## JMK212ABJ106KG-T
designator C?  Capacitance: 10uF  (hidden comment: *)
Capacitor, Ceramic (MLCC), 10uF, ±10%, 6.3V, X5R, ±10%, SMD 0805; Manufacturer: Taiyo Yuden; Manufacturer Part Number: JMK212ABJ106KG-T; Package Size: 0805; JLCPCB Basic Part: No; JLCPCB Part Number: C386020; Supplier 1: LCSC; Category: Capacitors - MLCC; Supplier Part Number 1: C386020; Tolerance: ±10%; Voltage Rating: 6.3V; Temperature Coefficient: X5R; RoHS: Yes; ComponentLink1Description: Datasheet; ComponentLink1URL: https://wmsc.lcsc.com/wmsc/upload/file/pdf/v2/lcsc/1912111437_Taiyo-Yuden-JMK212ABJ106KG-T_C386020.pdf; ComponentLink2Description: JLCPCB Part URL; ComponentLink2URL: https://jlcpcb.com/partdetail/C386020; ComponentLink3Description: LCSC Part URL; ComponentLink3URL: https://lcsc.com/product-detail/Multilayer-Ceramic-Capacitors-MLCC---SMD-SMT_Taiyo-Yuden-Taiyo-Yuden-JMK212ABJ106KG-T_C386020.html
footprint CAP-0805 (0805 (2012M) Capacitor)
pins: 1, 2

## JMK212ABJ226KG-T
designator C?  Capacitance: 22uF  (hidden comment: *)
Capacitor, Ceramic (MLCC), 22uF, ±10%, 6.3V, X5R, ±10%, SMD 0805; Manufacturer: Taiyo Yuden; Manufacturer Part Number: JMK212ABJ226KG-T; Package Size: 0805; JLCPCB Basic Part: No; JLCPCB Part Number: C337454; Supplier 1: LCSC; Category: Capacitors - MLCC; Supplier Part Number 1: C337454; Tolerance: ±10%; Voltage Rating: 6.3V; Temperature Coefficient: X5R; RoHS: Yes; ComponentLink1Description: Datasheet; ComponentLink1URL: https://wmsc.lcsc.com/wmsc/upload/file/pdf/v2/lcsc/2304140030_Taiyo-Yuden-JMK212ABJ226KG-T_C337454.pdf; ComponentLink2Description: JLCPCB Part URL; ComponentLink2URL: https://jlcpcb.com/partdetail/C337454; ComponentLink3Description: LCSC Part URL; ComponentLink3URL: https://lcsc.com/product-detail/Multilayer-Ceramic-Capacitors-MLCC---SMD-SMT_Taiyo-Yuden-Taiyo-Yuden-JMK212ABJ226KG-T_C337454.html
footprint CAP-0805 (0805 (2012M) Capacitor)
pins: 1, 2

## JMK212ABJ226MG-T
designator C?  Capacitance: 22uF  (hidden comment: *)
Capacitor, Ceramic (MLCC), 22uF, ±20%, 6.3V, X5R, ±20%, SMD 0805; Manufacturer: Taiyo Yuden; Manufacturer Part Number: JMK212ABJ226MG-T; Package Size: 0805; JLCPCB Basic Part: No; JLCPCB Part Number: C239085; Supplier 1: LCSC; Category: Capacitors - MLCC; Supplier Part Number 1: C239085; Tolerance: ±20%; Voltage Rating: 6.3V; Temperature Coefficient: X5R; RoHS: Yes; ComponentLink1Description: Datasheet; ComponentLink1URL: https://wmsc.lcsc.com/wmsc/upload/file/pdf/v2/lcsc/2309051414_Taiyo-Yuden-JMK212ABJ226MG-T_C239085.pdf; ComponentLink2Description: JLCPCB Part URL; ComponentLink2URL: https://jlcpcb.com/partdetail/C239085; ComponentLink3Description: LCSC Part URL; ComponentLink3URL: https://lcsc.com/product-detail/Multilayer-Ceramic-Capacitors-MLCC---SMD-SMT_Taiyo-Yuden-Taiyo-Yuden-JMK212ABJ226MG-T_C239085.html
footprint CAP-0805 (0805 (2012M) Capacitor)
pins: 1, 2

## JMK212BBJ107MG-TE
designator C?  Capacitance: 100uF  (hidden comment: *)
Capacitor, Ceramic (MLCC), 100uF, ±20%, 6.3V, X5R, ±20%, SMD 0805; Manufacturer: Taiyo Yuden; Manufacturer Part Number: JMK212BBJ107MG-TE; Package Size: 0805; JLCPCB Basic Part: No; JLCPCB Part Number: C2880375; Supplier 1: LCSC; Category: Capacitors - MLCC; Supplier Part Number 1: C2880375; Tolerance: ±20%; Voltage Rating: 6.3V; Temperature Coefficient: X5R; RoHS: Yes; ComponentLink1Description: Datasheet; ComponentLink1URL: https://wmsc.lcsc.com/wmsc/upload/file/pdf/v2/lcsc/2108160930_Taiyo-Yuden-JMK212BBJ107MG-TE_C2880375.pdf; ComponentLink2Description: JLCPCB Part URL; ComponentLink2URL: https://jlcpcb.com/partdetail/C2880375; ComponentLink3Description: LCSC Part URL; ComponentLink3URL: https://lcsc.com/product-detail/Multilayer-Ceramic-Capacitors-MLCC---SMD-SMT_Taiyo-Yuden-Taiyo-Yuden-JMK212BBJ107MG-TE_C2880375.html
footprint CAP-0805 (0805 (2012M) Capacitor)
pins: 1, 2

## JMK212BBJ226MGHT
designator C?  Capacitance: 22uF  (hidden comment: *)
Capacitor, Ceramic (MLCC), 22uF, ±20%, 6.3V, X5R, ±20%, SMD 0805; Manufacturer: Taiyo Yuden; Manufacturer Part Number: JMK212BBJ226MGHT; Package Size: 0805; JLCPCB Basic Part: No; JLCPCB Part Number: C386021; Supplier 1: LCSC; Category: Capacitors - MLCC; Supplier Part Number 1: C386021; Tolerance: ±20%; Voltage Rating: 6.3V; Temperature Coefficient: X5R; RoHS: Yes; ComponentLink1Description: Datasheet; ComponentLink1URL: https://wmsc.lcsc.com/wmsc/upload/file/pdf/v2/lcsc/2304140030_Taiyo-Yuden-JMK212BBJ226MGHT_C386021.pdf; ComponentLink2Description: JLCPCB Part URL; ComponentLink2URL: https://jlcpcb.com/partdetail/C386021; ComponentLink3Description: LCSC Part URL; ComponentLink3URL: https://lcsc.com/product-detail/Multilayer-Ceramic-Capacitors-MLCC---SMD-SMT_Taiyo-Yuden-Taiyo-Yuden-JMK212BBJ226MGHT_C386021.html
footprint CAP-0805 (0805 (2012M) Capacitor)
pins: 1, 2

## JMK212BBJ476MG-T
designator C?  Capacitance: 47uF  (hidden comment: *)
Capacitor, Ceramic (MLCC), 47uF, ±20%, 6.3V, X5R, ±20%, SMD 0805; Manufacturer: Taiyo Yuden; Manufacturer Part Number: JMK212BBJ476MG-T; Package Size: 0805; JLCPCB Basic Part: No; JLCPCB Part Number: C386022; Supplier 1: LCSC; Category: Capacitors - MLCC; Supplier Part Number 1: C386022; Tolerance: ±20%; Voltage Rating: 6.3V; Temperature Coefficient: X5R; RoHS: Yes; ComponentLink1Description: Datasheet; ComponentLink1URL: https://wmsc.lcsc.com/wmsc/upload/file/pdf/v2/lcsc/2211282230_Taiyo-Yuden-JMK212BBJ476MG-T_C386022.pdf; ComponentLink2Description: JLCPCB Part URL; ComponentLink2URL: https://jlcpcb.com/partdetail/C386022; ComponentLink3Description: LCSC Part URL; ComponentLink3URL: https://lcsc.com/product-detail/Multilayer-Ceramic-Capacitors-MLCC---SMD-SMT_Taiyo-Yuden-Taiyo-Yuden-JMK212BBJ476MG-T_C386022.html
footprint CAP-0805 (0805 (2012M) Capacitor)
pins: 1, 2

## JMK212BC6226MG-T
designator C?  Capacitance: 22uF  (hidden comment: *)
Capacitor, Ceramic (MLCC), 22uF, ±20%, 6.3V, X6S, ±20%, SMD 0805; Manufacturer: Taiyo Yuden; Manufacturer Part Number: JMK212BC6226MG-T; Package Size: 0805; JLCPCB Basic Part: No; JLCPCB Part Number: C454107; Supplier 1: LCSC; Category: Capacitors - MLCC; Supplier Part Number 1: C454107; Tolerance: ±20%; Voltage Rating: 6.3V; Temperature Coefficient: X6S; RoHS: Yes; ComponentLink1Description: Datasheet; ComponentLink1URL: https://wmsc.lcsc.com/wmsc/upload/file/pdf/v2/lcsc/2304140030_Taiyo-Yuden-JMK212BC6226MG-T_C454107.pdf; ComponentLink2Description: JLCPCB Part URL; ComponentLink2URL: https://jlcpcb.com/partdetail/C454107; ComponentLink3Description: LCSC Part URL; ComponentLink3URL: https://lcsc.com/product-detail/Multilayer-Ceramic-Capacitors-MLCC---SMD-SMT_Taiyo-Yuden-Taiyo-Yuden-JMK212BC6226MG-T_C454107.html
footprint CAP-0805 (0805 (2012M) Capacitor)
pins: 1, 2

## JMK212BJ106KD-T
designator C?  Capacitance: 10uF  (hidden comment: *)
Capacitor, Ceramic (MLCC), 10uF, ±10%, 6.3V, X5R, ±10%, SMD 0805; Manufacturer: Taiyo Yuden; Manufacturer Part Number: JMK212BJ106KD-T; Package Size: 0805; JLCPCB Basic Part: No; JLCPCB Part Number: C92786; Supplier 1: LCSC; Category: Capacitors - MLCC; Supplier Part Number 1: C92786; Tolerance: ±10%; Voltage Rating: 6.3V; Temperature Coefficient: X5R; RoHS: Yes; ComponentLink1Description: Datasheet; ComponentLink1URL: https://wmsc.lcsc.com/wmsc/upload/file/pdf/v2/lcsc/2211282300_Taiyo-Yuden-JMK212BJ106KD-T_C92786.pdf; ComponentLink2Description: JLCPCB Part URL; ComponentLink2URL: https://jlcpcb.com/partdetail/C92786; ComponentLink3Description: LCSC Part URL; ComponentLink3URL: https://lcsc.com/product-detail/Multilayer-Ceramic-Capacitors-MLCC---SMD-SMT_Taiyo-Yuden-Taiyo-Yuden-JMK212BJ106KD-T_C92786.html
footprint CAP-0805 (0805 (2012M) Capacitor)
pins: 1, 2

## JMK212BJ106KG-T
designator C?  Capacitance: 10uF  (hidden comment: *)
Capacitor, Ceramic (MLCC), 10uF, ±10%, 6.3V, X5R, ±10%, SMD 0805; Manufacturer: Taiyo Yuden; Manufacturer Part Number: JMK212BJ106KG-T; Package Size: 0805; JLCPCB Basic Part: No; JLCPCB Part Number: C92787; Supplier 1: LCSC; Category: Capacitors - MLCC; Supplier Part Number 1: C92787; Tolerance: ±10%; Voltage Rating: 6.3V; Temperature Coefficient: X5R; RoHS: Yes; ComponentLink1Description: Datasheet; ComponentLink1URL: https://wmsc.lcsc.com/wmsc/upload/file/pdf/v2/lcsc/2211282300_Taiyo-Yuden-JMK212BJ106KG-T_C92787.pdf; ComponentLink2Description: JLCPCB Part URL; ComponentLink2URL: https://jlcpcb.com/partdetail/C92787; ComponentLink3Description: LCSC Part URL; ComponentLink3URL: https://lcsc.com/product-detail/Multilayer-Ceramic-Capacitors-MLCC---SMD-SMT_Taiyo-Yuden-Taiyo-Yuden-JMK212BJ106KG-T_C92787.html
footprint CAP-0805 (0805 (2012M) Capacitor)
pins: 1, 2

## JMK212BJ106MG-T
designator C?  Capacitance: 10uF  (hidden comment: *)
Capacitor, Ceramic (MLCC), 10uF, ±20%, 6.3V, X5R, ±20%, SMD 0805; Manufacturer: Taiyo Yuden; Manufacturer Part Number: JMK212BJ106MG-T; Package Size: 0805; JLCPCB Basic Part: No; JLCPCB Part Number: C386023; Supplier 1: LCSC; Category: Capacitors - MLCC; Supplier Part Number 1: C386023; Tolerance: ±20%; Voltage Rating: 6.3V; Temperature Coefficient: X5R; RoHS: Yes; ComponentLink1Description: Datasheet; ComponentLink1URL: https://wmsc.lcsc.com/wmsc/upload/file/pdf/v2/lcsc/2211282230_Taiyo-Yuden-JMK212BJ106MG-T_C386023.pdf; ComponentLink2Description: JLCPCB Part URL; ComponentLink2URL: https://jlcpcb.com/partdetail/C386023; ComponentLink3Description: LCSC Part URL; ComponentLink3URL: https://lcsc.com/product-detail/Multilayer-Ceramic-Capacitors-MLCC---SMD-SMT_Taiyo-Yuden-Taiyo-Yuden-JMK212BJ106MG-T_C386023.html
footprint CAP-0805 (0805 (2012M) Capacitor)
pins: 1, 2
